# Altium footprint library GSM.PcbLib: 8 footprints
Each footprint in its own frame and in the unit in brackets; x right, y up, seen from the top. Pads: shape width x height; smd on the part's side, far side on the other; paste and mask are expansions set on the pad; w line width, h text height; cw(c..) or ccw(c..) is an arc to the next point about the centre after c.
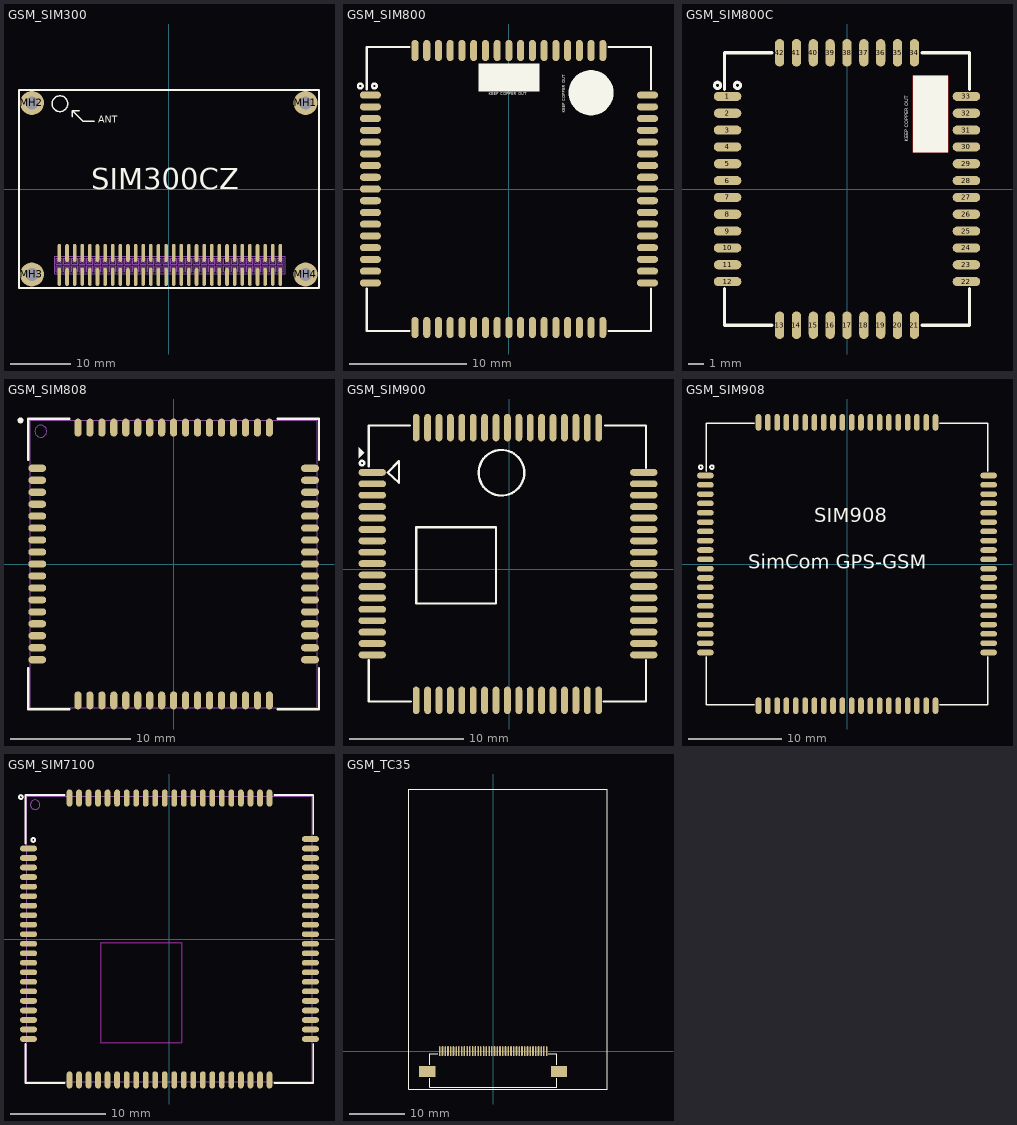
[diagram p0: the footprints below, top view; thin cyan lines are the x and y axes]

## GSM_SIM300 [mm]
height 1.092
pads (64):
  oval 0.6x3 smd: 1(-18.224,-14.6) 2(-18.224,-10.6) 3(-16.954,-14.6) 4(-16.954,-10.6) 5(-15.684,-14.6) 6(-15.684,-10.6) 7(-14.414,-14.6) 8(-14.414,-10.6) 9(-13.144,-14.6) 10(-13.144,-10.6) 11(-11.874,-14.6) 12(-11.874,-10.6) 13(-10.604,-14.6) 14(-10.604,-10.6) 15(-9.335,-14.6) 16(-9.335,-10.6) 17(-8.064,-14.6) 18(-8.064,-10.6) 19(-6.794,-14.6) 20(-6.794,-10.6) 21(-5.524,-14.6) 22(-5.524,-10.6) 23(-4.255,-14.6) 24(-4.255,-10.6) 25(-2.984,-14.6) 26(-2.984,-10.6) 27(-1.714,-14.6) 28(-1.714,-10.6) 29(-0.445,-14.6) 30(-0.445,-10.6) 31(0.826,-14.6) 32(0.826,-10.6) 33(2.095,-14.6) 34(2.095,-10.6) 35(3.365,-14.6) 36(3.365,-10.6) 37(4.635,-14.6) 38(4.635,-10.6) 39(5.905,-14.6) 40(5.905,-10.6) 41(7.175,-14.6) 42(7.175,-10.6) 43(8.445,-14.6) 44(8.445,-10.6) 45(9.716,-14.6) 46(9.716,-10.6) 47(10.986,-14.6) 48(10.986,-10.6) 49(12.255,-14.6) 50(12.255,-10.6) 51(13.525,-14.6) 52(13.525,-10.6) 53(14.795,-14.6) 54(14.795,-10.6) 55(16.066,-14.6) 56(16.066,-10.6) 57(17.335,-14.6) 58(17.335,-10.6) 59(18.605,-14.6) 60(18.605,-10.6)
  round 4 hole 2.2: MH1(22.796,14.395) MH2(-22.796,14.395) MH3(-22.796,-14.18) MH4(22.796,-14.18)
Top Overlay:
  circle w0.254: c-18.135,14.268 r1.308
  lines w0.254: -16.066,12.109 -16.066,13.125 ; -14.922,13.125 -16.066,13.125 ; -12.383,11.347 -14.287,11.347 -16.066,13.125 ; -24.956,-16.446 25.045,-16.446 25.045,16.554 -24.956,16.554 -24.956,-16.446
  text "SIM300CZ" at -12.89,0.044 h3.56
  text "ANT" at -11.747,11.093 h1.14
Mechanical 1:
  drawing of 484 lines, arcs and shapes, not listed
  text "60" at 19.748,-9.862 h0.76
  text "59" at 19.748,-14.434 h0.76
  text "1" at -20.002,-15.45 h0.76
  text "2" at -20.002,-9.862 h0.76
3D body "User Library-SIM300C.step": height 8.79, standoff -3.05, extent -25.971,-16.488 26.51,16.635

## GSM_SIM800 [mm]
pads (68):
  oval 1.8x0.6 smd: 1(-11.8,8) 2(-11.8,7) 3(-11.8,6) 4(-11.8,5) 5(-11.8,4) 6(-11.8,3) 7(-11.8,2) 8(-11.8,1) 9(-11.8,0) 10(-11.8,-1) 11(-11.8,-2) 12(-11.8,-3) 13(-11.8,-4) 14(-11.8,-5) 15(-11.8,-6) 16(-11.8,-7) 17(-11.8,-8) 35(11.8,-8) 36(11.8,-7) 37(11.8,-6) 38(11.8,-5) 39(11.8,-4) 40(11.8,-3) 41(11.8,-2) 42(11.8,-1) 43(11.8,0) 44(11.8,1) 45(11.8,2) 46(11.8,3) 47(11.8,4) 48(11.8,5) 49(11.8,6) 50(11.8,7) 51(11.8,8)
  oval 0.6x1.8 smd: 18(-8,-11.8) 19(-7,-11.8) 20(-6,-11.8) 21(-5,-11.8) 22(-4,-11.8) 23(-3,-11.8) 24(-2,-11.8) 25(-1,-11.8) 26(0,-11.8) 27(1,-11.8) 28(2,-11.8) 29(3,-11.8) 30(4,-11.8) 31(5,-11.8) 32(6,-11.8) 33(7,-11.8) 34(8,-11.8) 52(8,11.8) 53(7,11.8) 54(6,11.8) 55(5,11.8) 56(4,11.8) 57(3,11.8) 58(2,11.8) 59(1,11.8) 60(0,11.8) 61(-1,11.8) 62(-2,11.8) 63(-3,11.8) 64(-4,11.8) 65(-5,11.8) 66(-6,11.8) 67(-7,11.8) 68(-8,11.8)
Top Overlay:
  circle w0.2: c-11.455,8.774 r0.2
  circle w0.2: c-12.655,8.774 r0.2
  rectangle: -2.6,8.3 2.6,10.7
  region: 5.1,8.2 5.1,8.387 5.173,8.754 5.316,9.1 5.524,9.411 5.789,9.676 6.1,9.884 6.446,10.027 6.813,10.1 7,10.1 7.187,10.1 7.554,10.027 7.9,9.884 8.211,9.676 8.476,9.411 8.684,9.1 8.827,8.754 8.9,8.387 8.9,8.2 8.9,8.013 8.827,7.646 8.684,7.3 8.476,6.989 8.211,6.724 7.9,6.516 7.554,6.373 7.187,6.3 7,6.3 6.813,6.3 6.446,6.373 6.1,6.516 5.789,6.724 5.524,6.989 5.316,7.3 5.173,7.646 5.1,8.013
  lines w0.2: -12.1,-8.5 -12.1,-12.1 -8.5,-12.1 ; -12.1,8.5 -12.1,12.1 -8.5,12.1 ; 8.5,-12.1 12.1,-12.1 12.1,-8.5 ; 8.5,12.1 12.1,12.1 12.1,8.5
  text "KEEP COPPER OUT" at 4.9,6.5 h0.4
  text "KEEP COPPER OUT" at -1.7,7.9 h0.4
3D body "User Library-SIM800.step": height 3.1, standoff 0.1, extent -12,-12 12,12

## GSM_SIM800C [mm] "GSM, SIM800C, 42-L, 15.7X17.6mm"
pads (42):
  oval 1.8x0.6 smd: 1(-7.8,6.05) 2(-7.8,4.95) 3(-7.8,3.85) 4(-7.8,2.75) 5(-7.8,1.65) 6(-7.8,0.55) 7(-7.8,-0.55) 8(-7.8,-1.65) 9(-7.8,-2.75) 10(-7.8,-3.85) 11(-7.8,-4.95) 12(-7.8,-6.05) 22(7.8,-6.05) 23(7.8,-4.95) 24(7.8,-3.85) 25(7.8,-2.75) 26(7.8,-1.65) 27(7.8,-0.55) 28(7.8,0.55) 29(7.8,1.65) 30(7.8,2.75) 31(7.8,3.85) 32(7.8,4.95) 33(7.8,6.05)
  oval 0.6x1.8 smd: 13(-4.4,-8.9) 14(-3.3,-8.9) 15(-2.2,-8.9) 16(-1.1,-8.9) 17(0,-8.9) 18(1.1,-8.9) 19(2.2,-8.9) 20(3.3,-8.9) 21(4.4,-8.9) 34(4.4,8.9) 35(3.3,8.9) 36(2.2,8.9) 37(1.1,8.9) 38(0,8.9) 39(-1.1,8.9) 40(-2.2,8.9) 41(-3.3,8.9) 42(-4.4,8.9)
Top Layer:
  pour cut-out: 6.6,7.4 4.3,7.4 4.3,2.4 6.6,2.4
Top Overlay:
  circle w0.2: c-8.455,6.774 r0.2
  circle w0.2: c-7.155,6.774 r0.2
  rectangle: 4.3,2.4 6.6,7.4
  lines w0.2: -8,-6.5 -8,-8.9 -4.9,-8.9 ; -8,6.5 -8,8.9 -4.9,8.9 ; 4.9,-8.9 8,-8.9 8,-6.5 ; 4.9,8.9 8,8.9 8,6.5
  text "KEEP COPPER OUT" at 4.1,3.1 h0.4
3D body "SIM800C-1.STEP": height 2.37, standoff 0.03, extent -7.849,-8.812 7.851,8.788

## GSM_SIM808 [mm] "GSM Module, SIM808, 1mm pitch"
height 2.6
pads (68):
  oval 1.5x0.6 smd: 1(-11.4,8) 2(-11.4,7) 3(-11.4,6) 4(-11.4,5) 5(-11.4,4) 6(-11.4,3) 7(-11.4,2) 8(-11.4,1) 9(-11.4,0) 10(-11.4,-1) 11(-11.4,-2) 12(-11.4,-3) 13(-11.4,-4) 14(-11.4,-5) 15(-11.4,-6) 16(-11.4,-7) 17(-11.4,-8) 35(11.4,-8) 36(11.4,-7) 37(11.4,-6) 38(11.4,-5) 39(11.4,-4) 40(11.4,-3) 41(11.4,-2) 42(11.4,-1) 43(11.4,0) 44(11.4,1) 45(11.4,2) 46(11.4,3) 47(11.4,4) 48(11.4,5) 49(11.4,6) 50(11.4,7) 51(11.4,8)
  oval 0.6x1.5 smd: 18(-8,-11.4) 19(-7,-11.4) 20(-6,-11.4) 21(-5,-11.4) 22(-4,-11.4) 23(-3,-11.4) 24(-2,-11.4) 25(-1,-11.4) 26(0,-11.4) 27(1,-11.4) 28(2,-11.4) 29(3,-11.4) 30(4,-11.4) 31(5,-11.4) 32(6,-11.4) 33(7,-11.4) 34(8,-11.4) 52(8,11.4) 53(7,11.4) 54(6,11.4) 55(5,11.4) 56(4,11.4) 57(3,11.4) 58(2,11.4) 59(1,11.4) 60(0,11.4) 61(-1,11.4) 62(-2,11.4) 63(-3,11.4) 64(-4,11.4) 65(-5,11.4) 66(-6,11.4) 67(-7,11.4) 68(-8,11.4)
Top Overlay:
  circle w0.25: c-12.8,12 r0.125
  lines w0.2: -12.15,-8.7 -12.15,-12.15 -8.7,-12.15 ; -12.15,8.7 -12.15,12.15 -8.7,12.15 ; 8.7,-12.15 12.15,-12.15 12.15,-8.7 ; 8.7,12.15 12.15,12.15 12.15,8.7
Mechanical 13:
  circle w0.1: c-11.1,11.1 r0.5
  lines w0.1: -12,-12 12,-12 12,12 -12,12 -12,-12
3D body "User Library-SIM808.step": height 2.9, standoff 0, extent -12,-12 12,12

## GSM_SIM900 [mm] "SIM900_SIM900A"
pads (68):
  oval 2.4x0.6 smd mask+0.1: 1(-12,8.48) 2(-12,7.48) 3(-12,6.48) 4(-12,5.48) 5(-12,4.48) 6(-12,3.48) 7(-12,2.48) 8(-12,1.48) 9(-12,0.48) 10(-12,-0.52) 11(-12,-1.52) 12(-12,-2.52) 13(-12,-3.52) 14(-12,-4.52) 15(-12,-5.52) 16(-12,-6.52) 17(-12,-7.52) 35(11.8,-7.52) 36(11.8,-6.52) 37(11.8,-5.52) 38(11.8,-4.52) 39(11.8,-3.52) 40(11.8,-2.52) 41(11.8,-1.52) 42(11.8,-0.52) 43(11.8,0.48) 44(11.8,1.48) 45(11.8,2.48) 46(11.8,3.48) 47(11.8,4.48) 48(11.8,5.48) 49(11.8,6.48) 50(11.8,7.48) 51(11.8,8.48)
  oval 0.6x2.4 smd mask+0.1: 18(-8.15,-11.5) 19(-7.15,-11.5) 20(-6.15,-11.5) 21(-5.15,-11.5) 22(-4.15,-11.5) 23(-3.15,-11.5) 24(-2.15,-11.5) 25(-1.15,-11.5) 26(-0.15,-11.5) 27(0.85,-11.5) 28(1.85,-11.5) 29(2.85,-11.5) 30(3.85,-11.5) 31(4.85,-11.5) 32(5.85,-11.5) 33(6.85,-11.5) 34(7.85,-11.5) 52(7.85,12.4) 53(6.85,12.4) 54(5.85,12.4) 55(4.85,12.4) 56(3.85,12.4) 57(2.85,12.4) 58(1.85,12.4) 59(0.85,12.4) 60(-0.15,12.4) 61(-1.15,12.4) 62(-2.15,12.4) 63(-3.15,12.4) 64(-4.15,12.4) 65(-5.15,12.4) 66(-6.15,12.4) 67(-7.15,12.4) 68(-8.15,12.4)
Top Overlay:
  circle w0.2: c-0.67,8.45 r2
  circle w0.2: c-12.9,9.3 r0.2
  region: -13.2,9.7 -13.2,10.7 -12.7,10.2
  lines w0.2: -12.3,-8 -12.3,-11.6 -8.6,-11.6 ; -12.3,9 -12.3,12.6 -8.7,12.6 ; 8.3,-11.6 12,-11.6 12,-8 ; 8.4,12.6 12,12.6 12,8.9 ; -10.65,8.48 -9.65,7.58 -9.65,9.48 -10.65,8.48 ; -8.15,-3.02 -8.15,3.68 -1.15,3.68 -1.15,-3.02 -8.15,-3.02
3D body "GSM_SIM900.STEP": height 3, standoff 0, extent -12.15,-11.5 11.85,12.5

## GSM_SIM908 [mm] "SimCom Sim908 GPS/GSM"
pads (80):
  oval 1.8x0.6 smd: 1(-15.2,9.5) 2(-15.2,8.5) 3(-15.2,7.5) 4(-15.2,6.5) 5(-15.2,5.5) 6(-15.2,4.5) 7(-15.2,3.5) 8(-15.2,2.5) 9(-15.2,1.5) 10(-15.2,0.5) 11(-15.2,-0.5) 12(-15.2,-1.5) 13(-15.2,-2.5) 14(-15.2,-3.5) 15(-15.2,-4.5) 16(-15.2,-5.5) 17(-15.2,-6.5) 18(-15.2,-7.5) 19(-15.2,-8.5) 20(-15.2,-9.5) 41(15.2,-9.5) 42(15.2,-8.5) 43(15.2,-7.5) 44(15.2,-6.5) 45(15.2,-5.5) 46(15.2,-4.5) 47(15.2,-3.5) 48(15.2,-2.5) 49(15.2,-1.5) 50(15.2,-0.5) 51(15.2,0.5) 52(15.2,1.5) 53(15.2,2.5) 54(15.2,3.5) 55(15.2,4.5) 56(15.2,5.5) 57(15.2,6.5) 58(15.2,7.5) 59(15.2,8.5) 60(15.2,9.5)
  oval 0.6x1.8 smd: 21(-9.5,-15.2) 22(-8.5,-15.2) 23(-7.5,-15.2) 24(-6.5,-15.2) 25(-5.5,-15.2) 26(-4.5,-15.2) 27(-3.5,-15.2) 28(-2.5,-15.2) 29(-1.5,-15.2) 30(-0.5,-15.2) 31(0.5,-15.2) 32(1.5,-15.2) 33(2.5,-15.2) 34(3.5,-15.2) 35(4.5,-15.2) 36(5.5,-15.2) 37(6.5,-15.2) 38(7.5,-15.2) 39(8.5,-15.2) 40(9.5,-15.2) 61(9.5,15.2) 62(8.5,15.2) 63(7.5,15.2) 64(6.5,15.2) 65(5.5,15.2) 66(4.5,15.2) 67(3.5,15.2) 68(2.5,15.2) 69(1.5,15.2) 70(0.5,15.2) 71(-0.5,15.2) 72(-1.5,15.2) 73(-2.5,15.2) 74(-3.5,15.2) 75(-4.5,15.2) 76(-5.5,15.2) 77(-6.5,15.2) 78(-7.5,15.2) 79(-8.5,15.2) 80(-9.5,15.2)
Top Overlay:
  circle w0.2: c-14.5,10.4 r0.2
  circle w0.2: c-15.7,10.4 r0.2
  lines w0.2: -15.1,-10 -15.1,-15.1 -10,-15.1 ; -15.1,10 -15.1,15.1 -10,15.1 ; 10,-15.1 15.1,-15.1 15.1,-10 ; 10,15.1 15.1,15.1 15.1,10
  text "SimCom GPS-GSM" at -10.576,-0.5 h1.52
  text "SIM908" at -3.5,4.5 h1.52
3D body "User Library-SIM908.STEP": height 3.39, standoff 0.19, extent -15,-15 15,15

## GSM_SIM7100 [mm] "SIM7100 SIM5360 87-lead pitch:1mm 30x30mm"
height 2.9
pads (87):
  oval 1.8x0.6 smd mask+0.075: 1(-14.8,9.5) 2(-14.8,8.5) 3(-14.8,7.5) 4(-14.8,6.5) 5(-14.8,5.5) 6(-14.8,4.5) 7(-14.8,3.5) 8(-14.8,2.5) 9(-14.8,1.5) 10(-14.8,0.5) 11(-14.8,-0.5) 12(-14.8,-1.5) 13(-14.8,-2.5) 14(-14.8,-3.5) 15(-14.8,-4.5) 16(-14.8,-5.5) 17(-14.8,-6.5) 18(-14.8,-7.5) 19(-14.8,-8.5) 20(-14.8,-9.5) 41(14.8,-9.5) 42(14.8,-8.5) 43(14.8,-7.5) 44(14.8,-6.5) 45(14.8,-5.5) 46(14.8,-4.5) 47(14.8,-3.5) 48(14.8,-2.5) 49(14.8,-1.5) 50(14.8,-0.5) 51(14.8,0.5) 52(14.8,1.5) 53(14.8,2.5) 54(14.8,3.5) 55(14.8,4.5) 56(14.8,5.5) 57(14.8,6.5) 58(14.8,7.5) 59(14.8,8.5) 60(14.8,9.5) 81(-14.8,-10.5) 82(14.8,-10.5) 85(14.8,10.5)
  oval 0.6x1.8 smd mask+0.075: 21(-9.5,-14.8) 22(-8.5,-14.8) 23(-7.5,-14.8) 24(-6.5,-14.8) 25(-5.5,-14.8) 26(-4.5,-14.8) 27(-3.5,-14.8) 28(-2.5,-14.8) 29(-1.5,-14.8) 30(-0.5,-14.8) 31(0.5,-14.8) 32(1.5,-14.8) 33(2.5,-14.8) 34(3.5,-14.8) 35(4.5,-14.8) 36(5.5,-14.8) 37(6.5,-14.8) 38(7.5,-14.8) 39(8.5,-14.8) 40(9.5,-14.8) 61(9.5,14.8) 62(8.5,14.8) 63(7.5,14.8) 64(6.5,14.8) 65(5.5,14.8) 66(4.5,14.8) 67(3.5,14.8) 68(2.5,14.8) 69(1.5,14.8) 70(0.5,14.8) 71(-0.5,14.8) 72(-1.5,14.8) 73(-2.5,14.8) 74(-3.5,14.8) 75(-4.5,14.8) 76(-5.5,14.8) 77(-6.5,14.8) 78(-7.5,14.8) 79(-8.5,14.8) 80(-9.5,14.8) 83(10.5,-14.8) 84(-10.5,-14.8) 86(-10.5,14.8) 87(10.5,14.8)
Top Overlay:
  circle w0.2: c-15.6,14.9 r0.2
  circle w0.2: c-14.3,10.4 r0.2
  lines w0.2: -15.1,-11 -15.1,-15.1 -11,-15.1 ; -15.1,10 -15.1,15.1 -11,15.1 ; 11,-15.1 15.1,-15.1 15.1,-11 ; 11,15.1 15.1,15.1 15.1,11
Keep-Out Layer:
  lines w0.15: -7.2,-10.9 1.3,-10.9 1.3,-0.4 -7.2,-0.4 -7.2,-10.9
Mechanical 13:
  circle w0.1: c-14.1,14.1 r0.5
  lines w0.1: -15,-15 15,-15 15,15 -15,15 -15,-15
3D body "User Library-SIM7100C.step": height 3.17, standoff 0, extent -15,-15 15,15

## GSM_TC35 [mm]
pads (42):
  oval 0.3x1.8 smd mask+0.05: 1(9.75,0) 2(9.25,0) 3(8.75,0) 4(8.25,0) 5(7.75,0) 6(7.25,0) 7(6.75,0) 8(6.25,0) 9(5.75,0) 10(5.25,0) 11(4.75,0) 12(4.25,0) 13(3.75,0) 14(3.25,0) 15(2.75,0) 16(2.25,0) 17(1.75,0) 18(1.25,0) 19(0.75,0) 20(0.25,0) 21(-0.25,0) 22(-0.75,0) 23(-1.25,0) 24(-1.75,0) 25(-2.25,0) 26(-2.75,0) 27(-3.25,0) 28(-3.75,0) 29(-4.25,0) 30(-4.75,0) 31(-5.25,0) 32(-5.75,0) 33(-6.25,0) 34(-6.75,0) 35(-7.25,0) 36(-7.75,0) 37(-8.25,0) 38(-8.75,0) 39(-9.25,0) 40(-9.75,0)
  rrect0% 3x2 smd: ""(-12,-3.7) ""(12,-3.7)
Top Overlay:
  lines w0.2: -11.6,-4.9 -11.6,-6.6 11.55,-6.6 ; -11.6,-2.5 -11.6,-0.5 -10.074,-0.5 ; 10.074,-0.5 11.6,-0.5 11.6,-2.5 ; 11.6,-6.6 11.6,-4.9 ; -15.4,-6.9 -15.4,47.8 20.8,47.8 20.8,-6.9 -15.4,-6.9
3D body "User Library-siemens tc35i module.STEP": height 5.55, standoff 2, extent -15.264,-6.772 20.736,47.728
3D body: height 3, standoff 0.1, extent -11.5,-6.6 11.55,-0.6